# Altium integrated library Samtec_2_mm_Pitch_Socket_Strips.IntLib: 251 symbols (part 1 of 3) (continued)
## CLT-132-02-F-D
designator J?
Low Profile Dual Wipe Socket, Surface Mount, Vertical, -55 to 125 degC, 2 mm Pitch, 64-Pin, Female, RoHS; Manufacturer: Samtec; PartNumber: CLT-132-02-F-D; Pitch: 2 mm; DatasheetVersion: F-214; PackageVersion: CA, 10/1994; PackageReference: CLT-132-02-X-D; PackageDescription: 2mm Low Profile Socket Strip; Orientation: Vertical; RoHS: True; Temperature Range: -55 to 125 degC; Mounting Technology: Surface Mount; ComponentLink1Description: Manufacturer URL; ComponentLink1URL: http://www.samtec.com; ComponentLink2Description: Datasheet; ComponentLink2URL: http://www.samtec.com/documents/webfiles/pdf/CLT.PDF; ComponentLink3Description: Package Specification; ComponentLink3URL: http://www.samtec.com/documents/webfiles/cpdf/CLT-1XX-02-XX-D-XX-MKT.pdf
footprint SMTC-CLT-132-02-X-D (Low Profile Socket Strip, 2x32 Pins, Vertical, 2mm Pitch, Female)
pins: 1, 2, 3, 4, 5, 6, 7, 8, 9, 10, 11, 12, 13, 14, 15, 16, 17, 18, 19, 20, 21, 22, 23, 24, 25, 26, 27, 28, 29, 30, 31, 32, 33, 34, 35, 36, 37, 38, 39, 40, 41, 42, 43, 44, 45, 46, 47, 48, 49, 50, 51, 52, 53, 54, 55, 56, 57, 58, 59, 60, 61, 62, 63, 64

## CLT-132-02-G-D
designator J?
Low Profile Dual Wipe Socket, Surface Mount, Vertical, -55 to 125 degC, 2 mm Pitch, 64-Pin, Female, RoHS; Manufacturer: Samtec; PartNumber: CLT-132-02-G-D; Pitch: 2 mm; DatasheetVersion: F-214; PackageVersion: CA, 10/1994; PackageReference: CLT-132-02-X-D; PackageDescription: 2mm Low Profile Socket Strip; Supplier 1: Digi-Key; Supplier Part Number 1: SAM1165-32-ND; Orientation: Vertical; RoHS: True; Temperature Range: -55 to 125 degC; Mounting Technology: Surface Mount; ComponentLink1Description: Manufacturer URL; ComponentLink1URL: http://www.samtec.com; ComponentLink2Description: Datasheet; ComponentLink2URL: http://www.samtec.com/documents/webfiles/pdf/CLT.PDF; ComponentLink3Description: Package Specification; ComponentLink3URL: http://www.samtec.com/documents/webfiles/cpdf/CLT-1XX-02-XX-D-XX-MKT.pdf
footprint SMTC-CLT-132-02-X-D (Low Profile Socket Strip, 2x32 Pins, Vertical, 2mm Pitch, Female)
pins: 1, 2, 3, 4, 5, 6, 7, 8, 9, 10, 11, 12, 13, 14, 15, 16, 17, 18, 19, 20, 21, 22, 23, 24, 25, 26, 27, 28, 29, 30, 31, 32, 33, 34, 35, 36, 37, 38, 39, 40, 41, 42, 43, 44, 45, 46, 47, 48, 49, 50, 51, 52, 53, 54, 55, 56, 57, 58, 59, 60, 61, 62, 63, 64

## CLT-132-02-L-D
designator J?
Low Profile Dual Wipe Socket, Surface Mount, Vertical, -55 to 125 degC, 2 mm Pitch, 64-Pin, Female, RoHS; Manufacturer: Samtec; PartNumber: CLT-132-02-L-D; Pitch: 2 mm; DatasheetVersion: F-214; PackageVersion: CA, 10/1994; PackageReference: CLT-132-02-X-D; PackageDescription: 2mm Low Profile Socket Strip; Supplier 1: Digi-Key; Supplier Part Number 1: SAM1166-32-ND; Supplier 2: Farnell; Supplier Part Number 2: 2308504; Supplier 3: Newark; Supplier Part Number 3: 11P4065; Supplier 4: Newark; Supplier Part Number 4: 69W8469; Orientation: Vertical; RoHS: True; Temperature Range: -55 to 125 degC; Mounting Technology: Surface Mount; ComponentLink1Description: Manufacturer URL; ComponentLink1URL: http://www.samtec.com; ComponentLink2Description: Datasheet; ComponentLink2URL: http://www.samtec.com/documents/webfiles/pdf/CLT.PDF; ComponentLink3Description: Package Specification; ComponentLink3URL: http://www.samtec.com/documents/webfiles/cpdf/CLT-1XX-02-XX-D-XX-MKT.pdf
footprint SMTC-CLT-132-02-X-D (Low Profile Socket Strip, 2x32 Pins, Vertical, 2mm Pitch, Female)
pins: 1, 2, 3, 4, 5, 6, 7, 8, 9, 10, 11, 12, 13, 14, 15, 16, 17, 18, 19, 20, 21, 22, 23, 24, 25, 26, 27, 28, 29, 30, 31, 32, 33, 34, 35, 36, 37, 38, 39, 40, 41, 42, 43, 44, 45, 46, 47, 48, 49, 50, 51, 52, 53, 54, 55, 56, 57, 58, 59, 60, 61, 62, 63, 64

## LS2-105-01-F-D-RA1
designator J?
Self Mating Hermaphroditic Strip, Through-hole, Right Angle, -55 to 125 degC, 2 mm Pitch, 10-Pin, RoHS; Manufacturer: Samtec; PartNumber: LS2-105-01-F-D-RA1; Pitch: 2 mm; DatasheetVersion: F-214; PackageVersion: R, 4/2002; PackageReference: LS2-105-01-X-D-RA1; PackageDescription: 2mm Terminal/Socket Combo; Supplier 1: Newark; Supplier Part Number 1: 85T5440; Orientation: Right Angle; RoHS: True; Temperature Range: -55 to 125 degC; Mounting Technology: Through-hole; ComponentLink1Description: Manufacturer URL; ComponentLink1URL: http://www.samtec.com; ComponentLink2Description: Datasheet; ComponentLink2URL: http://www.samtec.com/documents/webfiles/pdf/ls2.pdf; ComponentLink3Description: Package Specification; ComponentLink3URL: http://www.samtec.com/documents/webfiles/cpdf/LS2-1XX-XX-XX-D-XXX-X-MKT.pdf
footprint SMTC-LS2-105-01-X-D-RA1 (Terminal/Socket Combo, 2x5 Pins, Right Angle, 2mm Pitch)
pins: 1, 2, 3, 4, 5, 6, 7, 8, 9, 10

## LS2-105-01-F-D-RA2
designator J?
Self Mating Hermaphroditic Strip, Through-hole, Right Angle, -55 to 125 degC, 2 mm Pitch, 10-Pin, RoHS; Manufacturer: Samtec; PartNumber: LS2-105-01-F-D-RA2; Pitch: 2 mm; DatasheetVersion: F-214; PackageVersion: R, 4/2002; PackageReference: LS2-105-01-X-D-RA2; PackageDescription: 2mm Terminal/Socket Combo; Supplier 1: Newark; Supplier Part Number 1: 85T5441; Orientation: Right Angle; RoHS: True; Temperature Range: -55 to 125 degC; Mounting Technology: Through-hole; ComponentLink1Description: Manufacturer URL; ComponentLink1URL: http://www.samtec.com; ComponentLink2Description: Datasheet; ComponentLink2URL: http://www.samtec.com/documents/webfiles/pdf/ls2.pdf; ComponentLink3Description: Package Specification; ComponentLink3URL: http://www.samtec.com/documents/webfiles/cpdf/LS2-1XX-XX-XX-D-XXX-X-MKT.pdf
footprint SMTC-LS2-105-01-X-D-RA2 (Terminal/Socket Combo, 2x5 Pins, Right Angle, 2mm Pitch)
pins: 1, 2, 3, 4, 5, 6, 7, 8, 9, 10

## LS2-105-01-L-D-RA1
designator J?
Self Mating Hermaphroditic Strip, Through-hole, Right Angle, -55 to 125 degC, 2 mm Pitch, 10-Pin, RoHS; Manufacturer: Samtec; PartNumber: LS2-105-01-L-D-RA1; Pitch: 2 mm; DatasheetVersion: F-214; PackageVersion: R, 4/2002; PackageReference: LS2-105-01-X-D-RA1; PackageDescription: 2mm Terminal/Socket Combo; Supplier 1: Digi-Key; Supplier Part Number 1: LS2-105-01-L-D-RA1-ND; Supplier 2: Newark; Supplier Part Number 2: 40P2221; Orientation: Right Angle; RoHS: True; Temperature Range: -55 to 125 degC; Mounting Technology: Through-hole; ComponentLink1Description: Manufacturer URL; ComponentLink1URL: http://www.samtec.com; ComponentLink2Description: Datasheet; ComponentLink2URL: http://www.samtec.com/documents/webfiles/pdf/ls2.pdf; ComponentLink3Description: Package Specification; ComponentLink3URL: http://www.samtec.com/documents/webfiles/cpdf/LS2-1XX-XX-XX-D-XXX-X-MKT.pdf
footprint SMTC-LS2-105-01-X-D-RA1 (Terminal/Socket Combo, 2x5 Pins, Right Angle, 2mm Pitch)
pins: 1, 2, 3, 4, 5, 6, 7, 8, 9, 10

## LS2-105-01-L-D-RA2
designator J?
Self Mating Hermaphroditic Strip, Through-hole, Right Angle, -55 to 125 degC, 2 mm Pitch, 10-Pin, RoHS; Manufacturer: Samtec; PartNumber: LS2-105-01-L-D-RA2; Pitch: 2 mm; DatasheetVersion: F-214; PackageVersion: R, 4/2002; PackageReference: LS2-105-01-X-D-RA2; PackageDescription: 2mm Terminal/Socket Combo; Supplier 1: Newark; Supplier Part Number 1: 85T5442; Orientation: Right Angle; RoHS: True; Temperature Range: -55 to 125 degC; Mounting Technology: Through-hole; ComponentLink1Description: Manufacturer URL; ComponentLink1URL: http://www.samtec.com; ComponentLink2Description: Datasheet; ComponentLink2URL: http://www.samtec.com/documents/webfiles/pdf/ls2.pdf; ComponentLink3Description: Package Specification; ComponentLink3URL: http://www.samtec.com/documents/webfiles/cpdf/LS2-1XX-XX-XX-D-XXX-X-MKT.pdf
footprint SMTC-LS2-105-01-X-D-RA2 (Terminal/Socket Combo, 2x5 Pins, Right Angle, 2mm Pitch)
pins: 1, 2, 3, 4, 5, 6, 7, 8, 9, 10

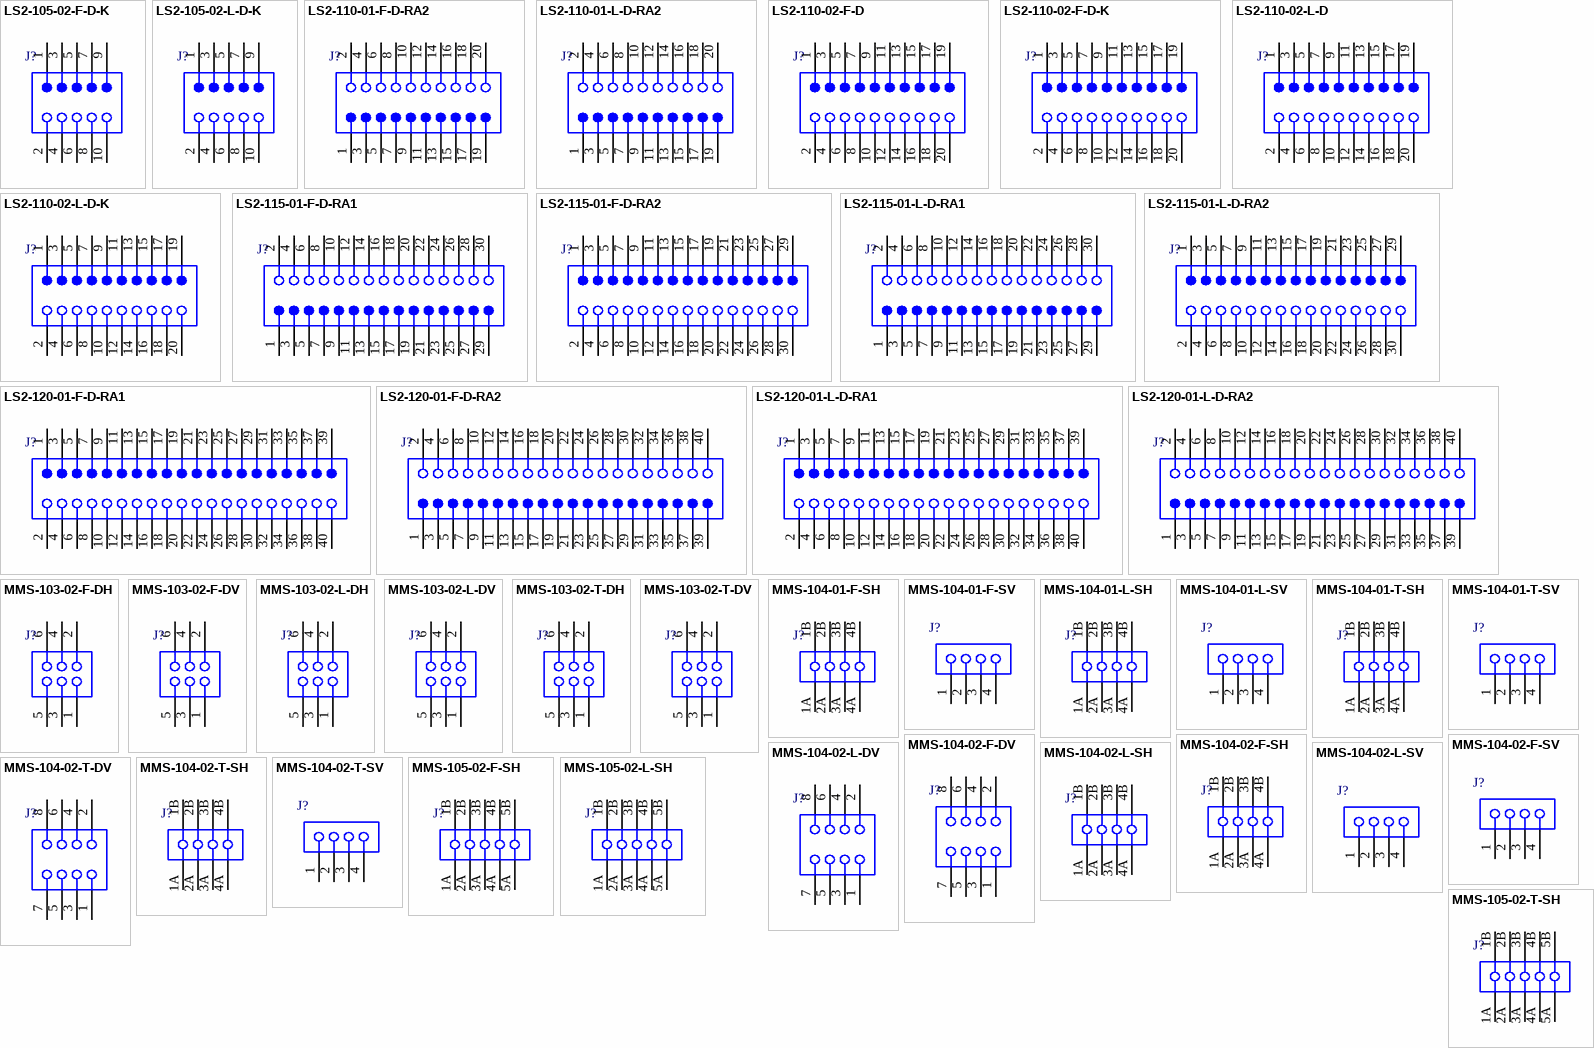
[diagram p1: symbols LS2-105-02-F-D-K to MMS-105-02-T-SH]

## LS2-105-02-F-D-K
designator J?
Self Mating Hermaphroditic Strip, Surface Mount, Vertical, -55 to 125 degC, 2 mm Pitch, 10-Pin, RoHS; Manufacturer: Samtec; PartNumber: LS2-105-02-F-D-K; Pitch: 2 mm; DatasheetVersion: F-214; PackageVersion: R, 4/2002; PackageReference: LS2-105-02-X-D-K; PackageDescription: 2mm Terminal/Socket Combo; Orientation: Vertical; RoHS: True; Temperature Range: -55 to 125 degC; Mounting Technology: Surface Mount; ComponentLink1Description: Manufacturer URL; ComponentLink1URL: http://www.samtec.com; ComponentLink2Description: Datasheet; ComponentLink2URL: http://www.samtec.com/documents/webfiles/pdf/ls2.pdf; ComponentLink3Description: Package Specification; ComponentLink3URL: http://www.samtec.com/documents/webfiles/cpdf/LS2-1XX-XX-XX-D-XXX-X-MKT.pdf
footprint SMTC-LS2-105-02-X-D-K (Terminal/Socket Combo, 2x5 Pins, Vertical, 2mm Pitch)
pins: 1, 2, 3, 4, 5, 6, 7, 8, 9, 10

## LS2-105-02-L-D-K
designator J?
Self Mating Hermaphroditic Strip, Surface Mount, Vertical, -55 to 125 degC, 2 mm Pitch, 10-Pin, RoHS; Manufacturer: Samtec; PartNumber: LS2-105-02-L-D-K; Pitch: 2 mm; DatasheetVersion: F-214; PackageVersion: R, 4/2002; PackageReference: LS2-105-02-X-D-K; PackageDescription: 2mm Terminal/Socket Combo; Orientation: Vertical; RoHS: True; Temperature Range: -55 to 125 degC; Mounting Technology: Surface Mount; ComponentLink1Description: Manufacturer URL; ComponentLink1URL: http://www.samtec.com; ComponentLink2Description: Datasheet; ComponentLink2URL: http://www.samtec.com/documents/webfiles/pdf/ls2.pdf; ComponentLink3Description: Package Specification; ComponentLink3URL: http://www.samtec.com/documents/webfiles/cpdf/LS2-1XX-XX-XX-D-XXX-X-MKT.pdf
footprint SMTC-LS2-105-02-X-D-K (Terminal/Socket Combo, 2x5 Pins, Vertical, 2mm Pitch)
pins: 1, 2, 3, 4, 5, 6, 7, 8, 9, 10

## LS2-110-01-F-D-RA2
designator J?
Self Mating Hermaphroditic Strip, Through-hole, Right Angle, -55 to 125 degC, 2 mm Pitch, 20-Pin, RoHS; Manufacturer: Samtec; PartNumber: LS2-110-01-F-D-RA2; Pitch: 2 mm; DatasheetVersion: F-214; PackageVersion: R, 4/2002; PackageReference: LS2-110-01-X-D-RA2; PackageDescription: 2mm Terminal/Socket Combo; Supplier 1: Newark; Supplier Part Number 1: 85T5445; Orientation: Right Angle; RoHS: True; Temperature Range: -55 to 125 degC; Mounting Technology: Through-hole; ComponentLink1Description: Manufacturer URL; ComponentLink1URL: http://www.samtec.com; ComponentLink2Description: Datasheet; ComponentLink2URL: http://www.samtec.com/documents/webfiles/pdf/ls2.pdf; ComponentLink3Description: Package Specification; ComponentLink3URL: http://www.samtec.com/documents/webfiles/cpdf/LS2-1XX-XX-XX-D-XXX-X-MKT.pdf
footprint SMTC-LS2-110-01-X-D-RA2 (Terminal/Socket Combo, 2x10 Pins, Right Angle, 2mm Pitch)
pins: 1, 2, 3, 4, 5, 6, 7, 8, 9, 10, 11, 12, 13, 14, 15, 16, 17, 18, 19, 20

## LS2-110-01-L-D-RA2
designator J?
Self Mating Hermaphroditic Strip, Through-hole, Right Angle, -55 to 125 degC, 2 mm Pitch, 20-Pin, RoHS; Manufacturer: Samtec; PartNumber: LS2-110-01-L-D-RA2; Pitch: 2 mm; DatasheetVersion: F-214; PackageVersion: R, 4/2002; PackageReference: LS2-110-01-X-D-RA2; PackageDescription: 2mm Terminal/Socket Combo; Supplier 1: Newark; Supplier Part Number 1: 67P3373; Orientation: Right Angle; RoHS: True; Temperature Range: -55 to 125 degC; Mounting Technology: Through-hole; ComponentLink1Description: Manufacturer URL; ComponentLink1URL: http://www.samtec.com; ComponentLink2Description: Datasheet; ComponentLink2URL: http://www.samtec.com/documents/webfiles/pdf/ls2.pdf; ComponentLink3Description: Package Specification; ComponentLink3URL: http://www.samtec.com/documents/webfiles/cpdf/LS2-1XX-XX-XX-D-XXX-X-MKT.pdf
footprint SMTC-LS2-110-01-X-D-RA2 (Terminal/Socket Combo, 2x10 Pins, Right Angle, 2mm Pitch)
pins: 1, 2, 3, 4, 5, 6, 7, 8, 9, 10, 11, 12, 13, 14, 15, 16, 17, 18, 19, 20

## LS2-110-02-F-D
designator J?
Self Mating Hermaphroditic Strip, Surface Mount, Vertical, -55 to 125 degC, 2 mm Pitch, 20-Pin, RoHS; Manufacturer: Samtec; PartNumber: LS2-110-02-F-D; Pitch: 2 mm; DatasheetVersion: F-214; PackageVersion: R, 4/2002; PackageReference: LS2-110-02-X-D; PackageDescription: 2mm Terminal/Socket Combo; Supplier 1: Newark; Supplier Part Number 1: 85T5446; Orientation: Vertical; RoHS: True; Temperature Range: -55 to 125 degC; Mounting Technology: Surface Mount; ComponentLink1Description: Manufacturer URL; ComponentLink1URL: http://www.samtec.com; ComponentLink2Description: Datasheet; ComponentLink2URL: http://www.samtec.com/documents/webfiles/pdf/ls2.pdf; ComponentLink3Description: Package Specification; ComponentLink3URL: http://www.samtec.com/documents/webfiles/cpdf/LS2-1XX-XX-XX-D-XXX-X-MKT.pdf
footprint SMTC-LS2-110-02-X-D (Terminal/Socket Combo, 2x10 Pins, Vertical, 2mm Pitch)
pins: 1, 2, 3, 4, 5, 6, 7, 8, 9, 10, 11, 12, 13, 14, 15, 16, 17, 18, 19, 20

## LS2-110-02-F-D-K
designator J?
Self Mating Hermaphroditic Strip, Surface Mount, Vertical, -55 to 125 degC, 2 mm Pitch, 20-Pin, RoHS; Manufacturer: Samtec; PartNumber: LS2-110-02-F-D-K; Pitch: 2 mm; DatasheetVersion: F-214; PackageVersion: R, 4/2002; PackageReference: LS2-110-02-X-D-K; PackageDescription: 2mm Terminal/Socket Combo; Orientation: Vertical; RoHS: True; Temperature Range: -55 to 125 degC; Mounting Technology: Surface Mount; ComponentLink1Description: Manufacturer URL; ComponentLink1URL: http://www.samtec.com; ComponentLink2Description: Datasheet; ComponentLink2URL: http://www.samtec.com/documents/webfiles/pdf/ls2.pdf; ComponentLink3Description: Package Specification; ComponentLink3URL: http://www.samtec.com/documents/webfiles/cpdf/LS2-1XX-XX-XX-D-XXX-X-MKT.pdf
footprint SMTC-LS2-110-02-X-D-K (Terminal/Socket Combo, 2x10 Pins, Vertical, 2mm Pitch)
pins: 1, 2, 3, 4, 5, 6, 7, 8, 9, 10, 11, 12, 13, 14, 15, 16, 17, 18, 19, 20

## LS2-110-02-L-D
designator J?
Self Mating Hermaphroditic Strip, Surface Mount, Vertical, -55 to 125 degC, 2 mm Pitch, 20-Pin, RoHS; Manufacturer: Samtec; PartNumber: LS2-110-02-L-D; Pitch: 2 mm; DatasheetVersion: F-214; PackageVersion: R, 4/2002; PackageReference: LS2-110-02-X-D; PackageDescription: 2mm Terminal/Socket Combo; Supplier 1: Newark; Supplier Part Number 1: 85T5447; Orientation: Vertical; RoHS: True; Temperature Range: -55 to 125 degC; Mounting Technology: Surface Mount; ComponentLink1Description: Manufacturer URL; ComponentLink1URL: http://www.samtec.com; ComponentLink2Description: Datasheet; ComponentLink2URL: http://www.samtec.com/documents/webfiles/pdf/ls2.pdf; ComponentLink3Description: Package Specification; ComponentLink3URL: http://www.samtec.com/documents/webfiles/cpdf/LS2-1XX-XX-XX-D-XXX-X-MKT.pdf
footprint SMTC-LS2-110-02-X-D (Terminal/Socket Combo, 2x10 Pins, Vertical, 2mm Pitch)
pins: 1, 2, 3, 4, 5, 6, 7, 8, 9, 10, 11, 12, 13, 14, 15, 16, 17, 18, 19, 20

## LS2-110-02-L-D-K
designator J?
Self Mating Hermaphroditic Strip, Surface Mount, Vertical, -55 to 125 degC, 2 mm Pitch, 20-Pin, RoHS; Manufacturer: Samtec; PartNumber: LS2-110-02-L-D-K; Pitch: 2 mm; DatasheetVersion: F-214; PackageVersion: R, 4/2002; PackageReference: LS2-110-02-X-D-K; PackageDescription: 2mm Terminal/Socket Combo; Orientation: Vertical; RoHS: True; Temperature Range: -55 to 125 degC; Mounting Technology: Surface Mount; ComponentLink1Description: Manufacturer URL; ComponentLink1URL: http://www.samtec.com; ComponentLink2Description: Datasheet; ComponentLink2URL: http://www.samtec.com/documents/webfiles/pdf/ls2.pdf; ComponentLink3Description: Package Specification; ComponentLink3URL: http://www.samtec.com/documents/webfiles/cpdf/LS2-1XX-XX-XX-D-XXX-X-MKT.pdf
footprint SMTC-LS2-110-02-X-D-K (Terminal/Socket Combo, 2x10 Pins, Vertical, 2mm Pitch)
pins: 1, 2, 3, 4, 5, 6, 7, 8, 9, 10, 11, 12, 13, 14, 15, 16, 17, 18, 19, 20

## LS2-115-01-F-D-RA1
designator J?
Self Mating Hermaphroditic Strip, Through-hole, Right Angle, -55 to 125 degC, 2 mm Pitch, 30-Pin, RoHS; Manufacturer: Samtec; PartNumber: LS2-115-01-F-D-RA1; Pitch: 2 mm; DatasheetVersion: F-214; PackageVersion: R, 4/2002; PackageReference: LS2-115-01-X-D-RA1; PackageDescription: 2mm Terminal/Socket Combo; Supplier 1: Newark; Supplier Part Number 1: 85T5448; Orientation: Right Angle; RoHS: True; Temperature Range: -55 to 125 degC; Mounting Technology: Through-hole; ComponentLink1Description: Manufacturer URL; ComponentLink1URL: http://www.samtec.com; ComponentLink2Description: Datasheet; ComponentLink2URL: http://www.samtec.com/documents/webfiles/pdf/ls2.pdf; ComponentLink3Description: Package Specification; ComponentLink3URL: http://www.samtec.com/documents/webfiles/cpdf/LS2-1XX-XX-XX-D-XXX-X-MKT.pdf
footprint SMTC-LS2-115-01-X-D-RA1 (Terminal/Socket Combo, 2x15 Pins, Right Angle, 2mm Pitch)
pins: 1, 2, 3, 4, 5, 6, 7, 8, 9, 10, 11, 12, 13, 14, 15, 16, 17, 18, 19, 20, 21, 22, 23, 24, 25, 26, 27, 28, 29, 30

## LS2-115-01-F-D-RA2
designator J?
Self Mating Hermaphroditic Strip, Through-hole, Right Angle, -55 to 125 degC, 2 mm Pitch, 30-Pin, RoHS; Manufacturer: Samtec; PartNumber: LS2-115-01-F-D-RA2; Pitch: 2 mm; DatasheetVersion: F-214; PackageVersion: R, 4/2002; PackageReference: LS2-115-01-X-D-RA2; PackageDescription: 2mm Terminal/Socket Combo; Supplier 1: Newark; Supplier Part Number 1: 85T5449; Orientation: Right Angle; RoHS: True; Temperature Range: -55 to 125 degC; Mounting Technology: Through-hole; ComponentLink1Description: Manufacturer URL; ComponentLink1URL: http://www.samtec.com; ComponentLink2Description: Datasheet; ComponentLink2URL: http://www.samtec.com/documents/webfiles/pdf/ls2.pdf; ComponentLink3Description: Package Specification; ComponentLink3URL: http://www.samtec.com/documents/webfiles/cpdf/LS2-1XX-XX-XX-D-XXX-X-MKT.pdf
footprint SMTC-LS2-115-01-X-D-RA2 (Terminal/Socket Combo, 2x15 Pins, Right Angle, 2mm Pitch)
pins: 1, 2, 3, 4, 5, 6, 7, 8, 9, 10, 11, 12, 13, 14, 15, 16, 17, 18, 19, 20, 21, 22, 23, 24, 25, 26, 27, 28, 29, 30

## LS2-115-01-L-D-RA1
designator J?
Self Mating Hermaphroditic Strip, Through-hole, Right Angle, -55 to 125 degC, 2 mm Pitch, 30-Pin, RoHS; Manufacturer: Samtec; PartNumber: LS2-115-01-L-D-RA1; Pitch: 2 mm; DatasheetVersion: F-214; PackageVersion: R, 4/2002; PackageReference: LS2-115-01-X-D-RA1; PackageDescription: 2mm Terminal/Socket Combo; Supplier 1: Newark; Supplier Part Number 1: 85T5450; Orientation: Right Angle; RoHS: True; Temperature Range: -55 to 125 degC; Mounting Technology: Through-hole; ComponentLink1Description: Manufacturer URL; ComponentLink1URL: http://www.samtec.com; ComponentLink2Description: Datasheet; ComponentLink2URL: http://www.samtec.com/documents/webfiles/pdf/ls2.pdf; ComponentLink3Description: Package Specification; ComponentLink3URL: http://www.samtec.com/documents/webfiles/cpdf/LS2-1XX-XX-XX-D-XXX-X-MKT.pdf
footprint SMTC-LS2-115-01-X-D-RA1 (Terminal/Socket Combo, 2x15 Pins, Right Angle, 2mm Pitch)
pins: 1, 2, 3, 4, 5, 6, 7, 8, 9, 10, 11, 12, 13, 14, 15, 16, 17, 18, 19, 20, 21, 22, 23, 24, 25, 26, 27, 28, 29, 30

## LS2-115-01-L-D-RA2
designator J?
Self Mating Hermaphroditic Strip, Through-hole, Right Angle, -55 to 125 degC, 2 mm Pitch, 30-Pin, RoHS; Manufacturer: Samtec; PartNumber: LS2-115-01-L-D-RA2; Pitch: 2 mm; DatasheetVersion: F-214; PackageVersion: R, 4/2002; PackageReference: LS2-115-01-X-D-RA2; PackageDescription: 2mm Terminal/Socket Combo; Orientation: Right Angle; RoHS: True; Temperature Range: -55 to 125 degC; Mounting Technology: Through-hole; ComponentLink1Description: Manufacturer URL; ComponentLink1URL: http://www.samtec.com; ComponentLink2Description: Datasheet; ComponentLink2URL: http://www.samtec.com/documents/webfiles/pdf/ls2.pdf; ComponentLink3Description: Package Specification; ComponentLink3URL: http://www.samtec.com/documents/webfiles/cpdf/LS2-1XX-XX-XX-D-XXX-X-MKT.pdf
footprint SMTC-LS2-115-01-X-D-RA2 (Terminal/Socket Combo, 2x15 Pins, Right Angle, 2mm Pitch)
pins: 1, 2, 3, 4, 5, 6, 7, 8, 9, 10, 11, 12, 13, 14, 15, 16, 17, 18, 19, 20, 21, 22, 23, 24, 25, 26, 27, 28, 29, 30

## LS2-120-01-F-D-RA1
designator J?
Self Mating Hermaphroditic Strip, Through-hole, Right Angle, -55 to 125 degC, 2 mm Pitch, 40-Pin, RoHS; Manufacturer: Samtec; PartNumber: LS2-120-01-F-D-RA1; Pitch: 2 mm; DatasheetVersion: F-214; PackageVersion: R, 4/2002; PackageReference: LS2-120-01-X-D-RA1; PackageDescription: 2mm Terminal/Socket Combo; Supplier 1: Newark; Supplier Part Number 1: 85T5454; Orientation: Right Angle; RoHS: True; Temperature Range: -55 to 125 degC; Mounting Technology: Through-hole; ComponentLink1Description: Manufacturer URL; ComponentLink1URL: http://www.samtec.com; ComponentLink2Description: Datasheet; ComponentLink2URL: http://www.samtec.com/documents/webfiles/pdf/ls2.pdf; ComponentLink3Description: Package Specification; ComponentLink3URL: http://www.samtec.com/documents/webfiles/cpdf/LS2-1XX-XX-XX-D-XXX-X-MKT.pdf
footprint SMTC-LS2-120-01-X-D-RA1 (Terminal/Socket Combo, 2x20 Pins, Right Angle, 2mm Pitch)
pins: 1, 2, 3, 4, 5, 6, 7, 8, 9, 10, 11, 12, 13, 14, 15, 16, 17, 18, 19, 20, 21, 22, 23, 24, 25, 26, 27, 28, 29, 30, 31, 32, 33, 34, 35, 36, 37, 38, 39, 40

## LS2-120-01-F-D-RA2
designator J?
Self Mating Hermaphroditic Strip, Through-hole, Right Angle, -55 to 125 degC, 2 mm Pitch, 40-Pin, RoHS; Manufacturer: Samtec; PartNumber: LS2-120-01-F-D-RA2; Pitch: 2 mm; DatasheetVersion: F-214; PackageVersion: R, 4/2002; PackageReference: LS2-120-01-X-D-RA2; PackageDescription: 2mm Terminal/Socket Combo; Supplier 1: Newark; Supplier Part Number 1: 85T5455; Orientation: Right Angle; RoHS: True; Temperature Range: -55 to 125 degC; Mounting Technology: Through-hole; ComponentLink1Description: Manufacturer URL; ComponentLink1URL: http://www.samtec.com; ComponentLink2Description: Datasheet; ComponentLink2URL: http://www.samtec.com/documents/webfiles/pdf/ls2.pdf; ComponentLink3Description: Package Specification; ComponentLink3URL: http://www.samtec.com/documents/webfiles/cpdf/LS2-1XX-XX-XX-D-XXX-X-MKT.pdf
footprint SMTC-LS2-120-01-X-D-RA2 (Terminal/Socket Combo, 2x20 Pins, Right Angle, 2mm Pitch)
pins: 1, 2, 3, 4, 5, 6, 7, 8, 9, 10, 11, 12, 13, 14, 15, 16, 17, 18, 19, 20, 21, 22, 23, 24, 25, 26, 27, 28, 29, 30, 31, 32, 33, 34, 35, 36, 37, 38, 39, 40

## LS2-120-01-L-D-RA1
designator J?
Self Mating Hermaphroditic Strip, Through-hole, Right Angle, -55 to 125 degC, 2 mm Pitch, 40-Pin, RoHS; Manufacturer: Samtec; PartNumber: LS2-120-01-L-D-RA1; Pitch: 2 mm; DatasheetVersion: F-214; PackageVersion: R, 4/2002; PackageReference: LS2-120-01-X-D-RA1; PackageDescription: 2mm Terminal/Socket Combo; Supplier 1: Newark; Supplier Part Number 1: 85T5456; Orientation: Right Angle; RoHS: True; Temperature Range: -55 to 125 degC; Mounting Technology: Through-hole; ComponentLink1Description: Manufacturer URL; ComponentLink1URL: http://www.samtec.com; ComponentLink2Description: Datasheet; ComponentLink2URL: http://www.samtec.com/documents/webfiles/pdf/ls2.pdf; ComponentLink3Description: Package Specification; ComponentLink3URL: http://www.samtec.com/documents/webfiles/cpdf/LS2-1XX-XX-XX-D-XXX-X-MKT.pdf
footprint SMTC-LS2-120-01-X-D-RA1 (Terminal/Socket Combo, 2x20 Pins, Right Angle, 2mm Pitch)
pins: 1, 2, 3, 4, 5, 6, 7, 8, 9, 10, 11, 12, 13, 14, 15, 16, 17, 18, 19, 20, 21, 22, 23, 24, 25, 26, 27, 28, 29, 30, 31, 32, 33, 34, 35, 36, 37, 38, 39, 40

## LS2-120-01-L-D-RA2
designator J?
Self Mating Hermaphroditic Strip, Through-hole, Right Angle, -55 to 125 degC, 2 mm Pitch, 40-Pin, RoHS; Manufacturer: Samtec; PartNumber: LS2-120-01-L-D-RA2; Pitch: 2 mm; DatasheetVersion: F-214; PackageVersion: R, 4/2002; PackageReference: LS2-120-01-X-D-RA2; PackageDescription: 2mm Terminal/Socket Combo; Supplier 1: Newark; Supplier Part Number 1: 26R3374; Orientation: Right Angle; RoHS: True; Temperature Range: -55 to 125 degC; Mounting Technology: Through-hole; ComponentLink1Description: Manufacturer URL; ComponentLink1URL: http://www.samtec.com; ComponentLink2Description: Datasheet; ComponentLink2URL: http://www.samtec.com/documents/webfiles/pdf/ls2.pdf; ComponentLink3Description: Package Specification; ComponentLink3URL: http://www.samtec.com/documents/webfiles/cpdf/LS2-1XX-XX-XX-D-XXX-X-MKT.pdf
footprint SMTC-LS2-120-01-X-D-RA2 (Terminal/Socket Combo, 2x20 Pins, Right Angle, 2mm Pitch)
pins: 1, 2, 3, 4, 5, 6, 7, 8, 9, 10, 11, 12, 13, 14, 15, 16, 17, 18, 19, 20, 21, 22, 23, 24, 25, 26, 27, 28, 29, 30, 31, 32, 33, 34, 35, 36, 37, 38, 39, 40

## MMS-103-02-F-DH
designator J?
Tiger Claw(TM) Socket Strip, Surface Mount, Horizontal, -55 to 125 degC, 2 mm Pitch, 6-Pin, Female, RoHS; Manufacturer: Samtec; PartNumber: MMS-103-02-F-DH; Pitch: 2 mm; DatasheetVersion: F-214; PackageVersion: CI, 4/1994; PackageReference: MMS-103-02-X-DH; PackageDescription: 2mm Surface Mount Box Connector Strip ASM; Orientation: Horizontal; RoHS: True; Temperature Range: -55 to 125 degC; Mounting Technology: Surface Mount; ComponentLink1Description: Manufacturer URL; ComponentLink1URL: http://www.samtec.com; ComponentLink2Description: Datasheet; ComponentLink2URL: http://www.samtec.com/documents/webfiles/pdf/MMS.PDF; ComponentLink3Description: Package Specification; ComponentLink3URL: http://www.samtec.com/documents/webfiles/cpdf/MMS-1XX-02-XXX-XX-XX-XXX-MKT.pdf
footprint SMTC-MMS-103-02-X-DH (Surface Mount Box Connector Strip ASM, 2x3 Pins, Horizontal, 2mm Pitch, Female)
pins: 1, 2, 3, 4, 5, 6

## MMS-103-02-F-DV
designator J?
Tiger Claw(TM) Socket Strip, Surface Mount, Vertical, -55 to 125 degC, 2 mm Pitch, 6-Pin, Female, RoHS; Manufacturer: Samtec; PartNumber: MMS-103-02-F-DV; Pitch: 2 mm; DatasheetVersion: F-214; PackageVersion: CI, 4/1994; PackageReference: MMS-103-02-X-DV; PackageDescription: 2mm Surface Mount Box Connector Strip ASM; Orientation: Vertical; RoHS: True; Temperature Range: -55 to 125 degC; Mounting Technology: Surface Mount; ComponentLink1Description: Manufacturer URL; ComponentLink1URL: http://www.samtec.com; ComponentLink2Description: Datasheet; ComponentLink2URL: http://www.samtec.com/documents/webfiles/pdf/MMS.PDF; ComponentLink3Description: Package Specification; ComponentLink3URL: http://www.samtec.com/documents/webfiles/cpdf/MMS-1XX-02-XXX-XX-XX-XXX-MKT.pdf
footprint SMTC-MMS-103-02-X-DV (Surface Mount Box Connector Strip ASM, 2x3 Pins, Vertical, 2mm Pitch, Female)
pins: 1, 2, 3, 4, 5, 6

## MMS-103-02-L-DH
designator J?
Tiger Claw(TM) Socket Strip, Surface Mount, Horizontal, -55 to 125 degC, 2 mm Pitch, 6-Pin, Female, RoHS; Manufacturer: Samtec; PartNumber: MMS-103-02-L-DH; Pitch: 2 mm; DatasheetVersion: F-214; PackageVersion: CI, 4/1994; PackageReference: MMS-103-02-X-DH; PackageDescription: 2mm Surface Mount Box Connector Strip ASM; Supplier 1: Digi-Key; Supplier Part Number 1: SAM1235-03-ND; Supplier 2: Newark; Supplier Part Number 2: 11P5287; Orientation: Horizontal; RoHS: True; Temperature Range: -55 to 125 degC; Mounting Technology: Surface Mount; ComponentLink1Description: Manufacturer URL; ComponentLink1URL: http://www.samtec.com; ComponentLink2Description: Datasheet; ComponentLink2URL: http://www.samtec.com/documents/webfiles/pdf/MMS.PDF; ComponentLink3Description: Package Specification; ComponentLink3URL: http://www.samtec.com/documents/webfiles/cpdf/MMS-1XX-02-XXX-XX-XX-XXX-MKT.pdf
footprint SMTC-MMS-103-02-X-DH (Surface Mount Box Connector Strip ASM, 2x3 Pins, Horizontal, 2mm Pitch, Female)
pins: 1, 2, 3, 4, 5, 6

## MMS-103-02-L-DV
designator J?
Tiger Claw(TM) Socket Strip, Surface Mount, Vertical, -55 to 125 degC, 2 mm Pitch, 6-Pin, Female, RoHS; Manufacturer: Samtec; PartNumber: MMS-103-02-L-DV; Pitch: 2 mm; DatasheetVersion: F-214; PackageVersion: CI, 4/1994; PackageReference: MMS-103-02-X-DV; PackageDescription: 2mm Surface Mount Box Connector Strip ASM; Supplier 1: Digi-Key; Supplier Part Number 1: SAM1236-03-ND; Supplier 2: Newark; Supplier Part Number 2: 11P5288; Orientation: Vertical; RoHS: True; Temperature Range: -55 to 125 degC; Mounting Technology: Surface Mount; ComponentLink1Description: Manufacturer URL; ComponentLink1URL: http://www.samtec.com; ComponentLink2Description: Datasheet; ComponentLink2URL: http://www.samtec.com/documents/webfiles/pdf/MMS.PDF; ComponentLink3Description: Package Specification; ComponentLink3URL: http://www.samtec.com/documents/webfiles/cpdf/MMS-1XX-02-XXX-XX-XX-XXX-MKT.pdf
footprint SMTC-MMS-103-02-X-DV (Surface Mount Box Connector Strip ASM, 2x3 Pins, Vertical, 2mm Pitch, Female)
pins: 1, 2, 3, 4, 5, 6

## MMS-103-02-T-DH
designator J?
Tiger Claw(TM) Socket Strip, Surface Mount, Horizontal, -55 to 105 degC, 2 mm Pitch, 6-Pin, Female, RoHS; Manufacturer: Samtec; PartNumber: MMS-103-02-T-DH; Pitch: 2 mm; DatasheetVersion: F-214; PackageVersion: CI, 4/1994; PackageReference: MMS-103-02-X-DH; PackageDescription: 2mm Surface Mount Box Connector Strip ASM; Supplier 1: Digi-Key; Supplier Part Number 1: SAM1239-03-ND; Supplier 2: Newark; Supplier Part Number 2: 11P5291; Orientation: Horizontal; RoHS: True; Temperature Range: -55 to 105 degC; Mounting Technology: Surface Mount; ComponentLink1Description: Manufacturer URL; ComponentLink1URL: http://www.samtec.com; ComponentLink2Description: Datasheet; ComponentLink2URL: http://www.samtec.com/documents/webfiles/pdf/MMS.PDF; ComponentLink3Description: Package Specification; ComponentLink3URL: http://www.samtec.com/documents/webfiles/cpdf/MMS-1XX-02-XXX-XX-XX-XXX-MKT.pdf
footprint SMTC-MMS-103-02-X-DH (Surface Mount Box Connector Strip ASM, 2x3 Pins, Horizontal, 2mm Pitch, Female)
pins: 1, 2, 3, 4, 5, 6

## MMS-103-02-T-DV
designator J?
Tiger Claw(TM) Socket Strip, Surface Mount, Vertical, -55 to 105 degC, 2 mm Pitch, 6-Pin, Female, RoHS; Manufacturer: Samtec; PartNumber: MMS-103-02-T-DV; Pitch: 2 mm; DatasheetVersion: F-214; PackageVersion: CI, 4/1994; PackageReference: MMS-103-02-X-DV; PackageDescription: 2mm Surface Mount Box Connector Strip ASM; Supplier 1: Digi-Key; Supplier Part Number 1: SAM1240-03-ND; Orientation: Vertical; RoHS: True; Temperature Range: -55 to 105 degC; Mounting Technology: Surface Mount; ComponentLink1Description: Manufacturer URL; ComponentLink1URL: http://www.samtec.com; ComponentLink2Description: Datasheet; ComponentLink2URL: http://www.samtec.com/documents/webfiles/pdf/MMS.PDF; ComponentLink3Description: Package Specification; ComponentLink3URL: http://www.samtec.com/documents/webfiles/cpdf/MMS-1XX-02-XXX-XX-XX-XXX-MKT.pdf
footprint SMTC-MMS-103-02-X-DV (Surface Mount Box Connector Strip ASM, 2x3 Pins, Vertical, 2mm Pitch, Female)
pins: 1, 2, 3, 4, 5, 6

## MMS-104-01-F-SH
designator J?
Tiger Claw(TM) Socket Strip, Through-hole, Horizontal, -55 to 125 degC, 2 mm Pitch, 8-Pin, Female, RoHS; Manufacturer: Samtec; PartNumber: MMS-104-01-F-SH; Pitch: 2 mm; DatasheetVersion: F-214; PackageVersion: AO, 2/1993; PackageReference: MMS-104-01-X-SH; PackageDescription: 2mm Through Hole Box Connector Strip Assembly; Orientation: Horizontal; RoHS: True; Temperature Range: -55 to 125 degC; Mounting Technology: Through-hole; ComponentLink1Description: Manufacturer URL; ComponentLink1URL: http://www.samtec.com; ComponentLink2Description: Datasheet; ComponentLink2URL: http://www.samtec.com/documents/webfiles/pdf/MMS.PDF; ComponentLink3Description: Package Specification; ComponentLink3URL: http://www.samtec.com/documents/webfiles/cpdf/MMS-1XX-01-XXX-XX-XXX-MKT1.pdf
footprint SMTC-MMS-104-01-X-SH (Through Hole Box Connector Strip Assembly, 2x4 Pins, Horizontal, 2mm Pitch, Female)
pins: 1A, 1B, 2A, 2B, 3A, 3B, 4A, 4B

## MMS-104-01-F-SV
designator J?
Tiger Claw(TM) Socket Strip, Through-hole, Vertical, -55 to 125 degC, 2 mm Pitch, 4-Pin, Female, RoHS; Manufacturer: Samtec; PartNumber: MMS-104-01-F-SV; Pitch: 2 mm; DatasheetVersion: F-214; PackageVersion: AO, 2/1993; PackageReference: MMS-104-01-X-SV; PackageDescription: 2mm Through Hole Box Connector Strip Assembly; Orientation: Vertical; RoHS: True; Temperature Range: -55 to 125 degC; Mounting Technology: Through-hole; ComponentLink1Description: Manufacturer URL; ComponentLink1URL: http://www.samtec.com; ComponentLink2Description: Datasheet; ComponentLink2URL: http://www.samtec.com/documents/webfiles/pdf/MMS.PDF; ComponentLink3Description: Package Specification; ComponentLink3URL: http://www.samtec.com/documents/webfiles/cpdf/MMS-1XX-01-XXX-XX-XXX-MKT1.pdf
footprint SMTC-MMS-104-01-X-SV (Through Hole Box Connector Strip Assembly, 1x4 Pins, Vertical, 2mm Pitch, Female)
pins: 1, 2, 3, 4

## MMS-104-01-L-SH
designator J?
Tiger Claw(TM) Socket Strip, Through-hole, Horizontal, -55 to 125 degC, 2 mm Pitch, 8-Pin, Female, RoHS; Manufacturer: Samtec; PartNumber: MMS-104-01-L-SH; Pitch: 2 mm; DatasheetVersion: F-214; PackageVersion: AO, 2/1993; PackageReference: MMS-104-01-X-SH; PackageDescription: 2mm Through Hole Box Connector Strip Assembly; Supplier 1: Digi-Key; Supplier Part Number 1: SAM1229-04-ND; Supplier 2: Newark; Supplier Part Number 2: 11P5297; Orientation: Horizontal; RoHS: True; Temperature Range: -55 to 125 degC; Mounting Technology: Through-hole; ComponentLink1Description: Manufacturer URL; ComponentLink1URL: http://www.samtec.com; ComponentLink2Description: Datasheet; ComponentLink2URL: http://www.samtec.com/documents/webfiles/pdf/MMS.PDF; ComponentLink3Description: Package Specification; ComponentLink3URL: http://www.samtec.com/documents/webfiles/cpdf/MMS-1XX-01-XXX-XX-XXX-MKT1.pdf
footprint SMTC-MMS-104-01-X-SH (Through Hole Box Connector Strip Assembly, 2x4 Pins, Horizontal, 2mm Pitch, Female)
pins: 1A, 1B, 2A, 2B, 3A, 3B, 4A, 4B

## MMS-104-01-L-SV
designator J?
Tiger Claw(TM) Socket Strip, Through-hole, Vertical, -55 to 125 degC, 2 mm Pitch, 4-Pin, Female, RoHS; Manufacturer: Samtec; PartNumber: MMS-104-01-L-SV; Pitch: 2 mm; DatasheetVersion: F-214; PackageVersion: AO, 2/1993; PackageReference: MMS-104-01-X-SV; PackageDescription: 2mm Through Hole Box Connector Strip Assembly; Supplier 1: Digi-Key; Supplier Part Number 1: SAM1230-04-ND; Supplier 2: Newark; Supplier Part Number 2: 11P5298; Orientation: Vertical; RoHS: True; Temperature Range: -55 to 125 degC; Mounting Technology: Through-hole; ComponentLink1Description: Manufacturer URL; ComponentLink1URL: http://www.samtec.com; ComponentLink2Description: Datasheet; ComponentLink2URL: http://www.samtec.com/documents/webfiles/pdf/MMS.PDF; ComponentLink3Description: Package Specification; ComponentLink3URL: http://www.samtec.com/documents/webfiles/cpdf/MMS-1XX-01-XXX-XX-XXX-MKT1.pdf
footprint SMTC-MMS-104-01-X-SV (Through Hole Box Connector Strip Assembly, 1x4 Pins, Vertical, 2mm Pitch, Female)
pins: 1, 2, 3, 4

## MMS-104-01-T-SH
designator J?
Tiger Claw(TM) Socket Strip, Through-hole, Horizontal, -55 to 105 degC, 2 mm Pitch, 8-Pin, Female, RoHS; Manufacturer: Samtec; PartNumber: MMS-104-01-T-SH; Pitch: 2 mm; DatasheetVersion: F-214; PackageVersion: AO, 2/1993; PackageReference: MMS-104-01-X-SH; PackageDescription: 2mm Through Hole Box Connector Strip Assembly; Supplier 1: Digi-Key; Supplier Part Number 1: SAM1233-04-ND; Supplier 2: Newark; Supplier Part Number 2: 11P5301; Orientation: Horizontal; RoHS: True; Temperature Range: -55 to 105 degC; Mounting Technology: Through-hole; ComponentLink1Description: Manufacturer URL; ComponentLink1URL: http://www.samtec.com; ComponentLink2Description: Datasheet; ComponentLink2URL: http://www.samtec.com/documents/webfiles/pdf/MMS.PDF; ComponentLink3Description: Package Specification; ComponentLink3URL: http://www.samtec.com/documents/webfiles/cpdf/MMS-1XX-01-XXX-XX-XXX-MKT1.pdf
footprint SMTC-MMS-104-01-X-SH (Through Hole Box Connector Strip Assembly, 2x4 Pins, Horizontal, 2mm Pitch, Female)
pins: 1A, 1B, 2A, 2B, 3A, 3B, 4A, 4B
